# Altium footprint library ALL.PcbLib: 385 footprints (part 16 of 25)
Each footprint in its own frame and in the unit in brackets; x right, y up, seen from the top. Pads: shape width x height; smd on the part's side, far side on the other; paste and mask are expansions set on the pad; w line width, h text height; cw(c..) or ccw(c..) is an arc to the next point about the centre after c.
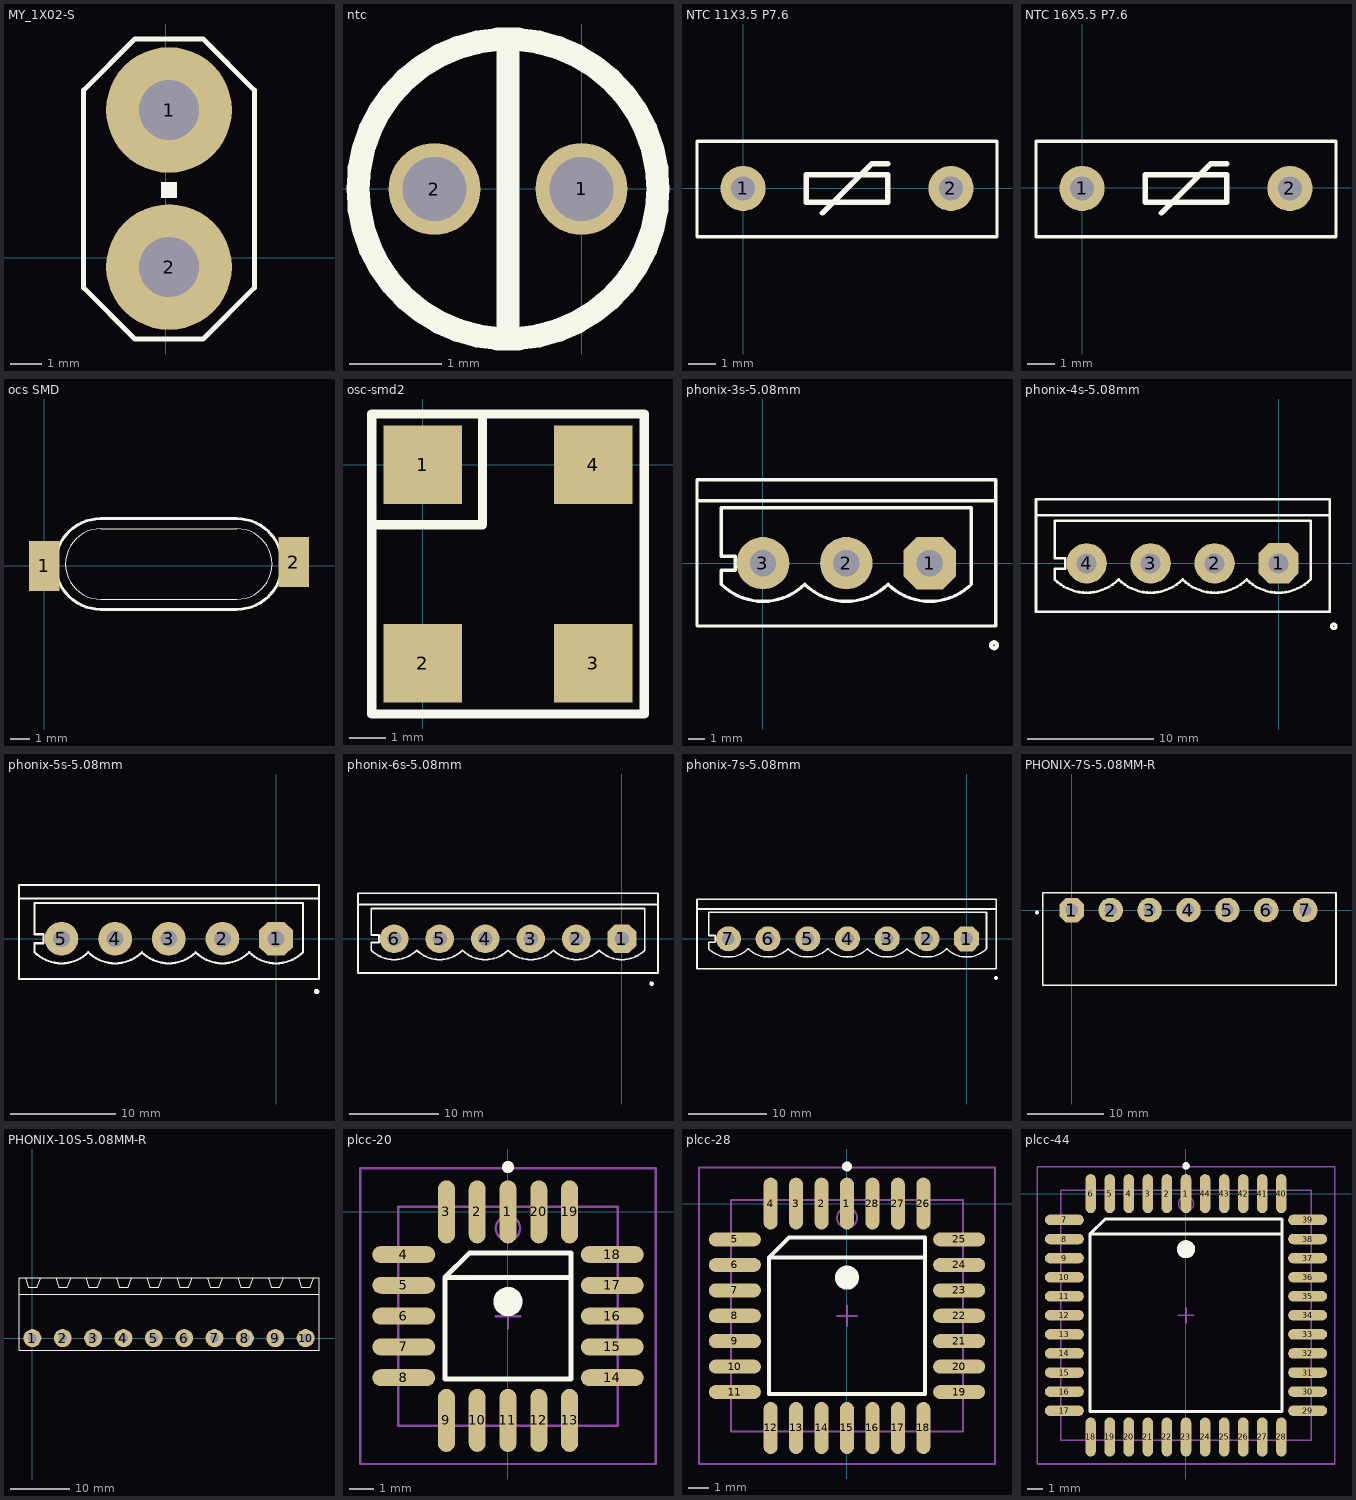
[diagram p15: the footprints below, top view; thin cyan lines are the x and y axes]

## MY_1X02-S [mm]
pads (2):
  round 4 hole 1.9: 1(0.102,4.699) 2(0.102,-0.301)
Top Overlay:
  region: -0.152,4.953 -0.152,4.445 0.356,4.445 0.356,4.953
  region: -0.152,2.413 -0.152,1.905 0.356,1.905 0.356,2.413
  lines w0.15: -0.94,6.96 1.143,6.96
  lines w0.152: -2.616,-0.965 -0.991,-2.591 1.194,-2.591 2.819,-0.965 2.819,5.334 1.194,6.96 -0.991,6.96 -2.616,5.334 -2.616,-0.965

## ntc [mm]
pads (2):
  round 1 hole 0.7: 1(0,0) 2(-1.6,0)
Top Overlay:
  circle w0.254: c-0.8,0 r1.632
  lines w0.254: -0.8,-1.6 -0.8,0 -0.8,1.6
3D body "NTC1.6mm.step": height 2.1, standoff -9, extent -1.8,-0.991 0.2,0.991

## NTC 11X3.5 P7.6 [mil]
pads (2):
  round 65 hole 35: 1(0,0) 2(300,0)
Top Overlay:
  lines w5: -66.47,-69.99 -66.47,68.36 366.43,68.36 366.43,-69.99 -66.47,-69.99
  lines w7.87: 114.57,-35.43 118.5,-31.5 185.43,35.43 209.06,35.43 ; 90.94,-19.68 209.06,-19.68 209.06,19.68 90.94,19.68 90.94,-19.68
3D body "JVR10N331k_vertical.STEP": height 472.44, standoff -98.43, extent -66.47,-69.99 366.47,68.36

## NTC 16X5.5 P7.6 [mil]
pads (2):
  round 65 hole 35: 1(0,-1) 2(300,-1)
Top Overlay:
  lines w5: -66.47,-70.99 366.43,-70.99 366.43,67.36 -66.47,67.36 -66.47,-70.99
  lines w7.87: 114.57,-36.43 118.5,-32.5 185.43,34.43 209.06,34.43 ; 90.94,-20.68 90.94,18.68 209.06,18.68 209.06,-20.68 90.94,-20.68
3D body "User Library-JNR15S060L.STEP": height 898.98, standoff -99.33, extent -162.99,-109.46 466.93,111.16

## ocs SMD [mil]
pads (2):
  rect 60x100 smd: 1(0,0) 2(495.1,7.87)
Top Overlay:
  lines w2: 112.06,-66.07 cw(c112.06,3.93) 112.06,73.93 382.06,73.93 cw(c382.06,3.93) 382.06,-66.07 112.06,-66.07
  lines w6: 112.06,-86.07 cw(c112.06,3.93) 112.06,93.93 382.06,93.93 cw(c382.06,3.93) 382.06,-86.07 112.06,-86.07
3D body "User Library-SMU4.STEP": height 154.3, standoff -3.18, extent 0,-94.49 492.13,94.49

## osc-smd2 [mil]
pads (4):
  rect 85x85 smd: 1(0,0) 2(0,-215) 3(185,-215) 4(185,0)
Top Overlay:
  lines w10: -55,-65 65,-65 65,55 ; -55,-270 240,-270 240,55 -55,55 -55,-270

## phonix-3s-5.08mm [mm]
pads (3):
  oct 3.2x3.2 hole 1.6: 1(10.185,0)
  round 3.2 hole 1.6: 2(5.105,0) 3(0.025,0)
Top Overlay:
  circle w0.254: c14.105,-5 r0.18
  lines w0.203: -3.996,3.81 14.207,3.81 ; -2.519,-1.274 ccw(c0.025,1.27) 2.57,-1.274 ; -2.515,-1.27 -2.515,-0.423 -1.668,-0.423 -1.668,0.423 -2.515,0.423 -2.515,3.387 12.725,3.387 12.725,-1.27 ; 2.561,-1.274 ccw(c5.105,1.27) 7.65,-1.274 ; 7.641,-1.274 ccw(c10.185,1.27) 12.73,-1.274 ; -3.996,-3.825 14.207,-3.825 14.207,5.08 -3.996,5.08 -3.996,-3.825
3D body "MSTBVA-3Way.stp": height 12, standoff -3.9, extent -3.395,-3.825 13.605,4.775

## phonix-4s-5.08mm [mm]
pads (4):
  oct 3.2x3.2 hole 1.6: 1(0,0)
  round 3.2 hole 1.6: 2(-5.08,0) 3(-10.16,0) 4(-15.24,0)
Top Overlay:
  circle w0.254: c4.38,-5 r0.18
  lines w0.203: -19.262,3.81 4.064,3.81 ; -17.784,-1.274 ccw(c-15.24,1.27) -12.696,-1.274 ; -17.78,-1.27 -17.78,-0.423 -16.933,-0.423 -16.933,0.423 -17.78,0.423 -17.78,3.387 2.54,3.387 2.54,-1.27 ; -12.704,-1.274 ccw(c-10.16,1.27) -7.616,-1.274 ; -7.624,-1.274 ccw(c-5.08,1.27) -2.536,-1.274 ; -2.544,-1.274 ccw(c0,1.27) 2.544,-1.274 ; -19.262,-3.825 4.064,-3.825 4.064,5.08 -19.262,5.08 -19.262,-3.825
3D body "MSTBVA-4Way.stp": height 12, standoff -3.9, extent -18.78,-3.81 3.54,4.79

## phonix-5s-5.08mm [mm]
pads (5):
  oct 3.2x3.2 hole 1.6: 1(0,0)
  round 3.2 hole 1.6: 2(-5.08,0) 3(-10.16,0) 4(-15.24,0) 5(-20.32,0)
Top Overlay:
  circle w0.254: c3.84,-5 r0.127
  lines w0.203: -24.342,3.81 4.064,3.81 ; -22.864,-1.274 ccw(c-20.32,1.27) -17.776,-1.274 ; -22.86,-1.27 -22.86,-0.423 -22.013,-0.423 -22.013,0.423 -22.86,0.423 -22.86,3.387 2.54,3.387 2.54,-1.27 ; -17.784,-1.274 ccw(c-15.24,1.27) -12.696,-1.274 ; -12.704,-1.274 ccw(c-10.16,1.27) -7.616,-1.274 ; -7.624,-1.274 ccw(c-5.08,1.27) -2.536,-1.274 ; -2.544,-1.274 ccw(c0,1.27) 2.544,-1.274 ; -24.342,-3.81 -24.342,5.08 4.064,5.08 4.064,-3.81 -24.342,-3.81
3D body "MSTBVA-5Way.stp": height 12, standoff -3.9, extent -23.86,-3.774 3.54,4.826

## phonix-6s-5.08mm [mm]
pads (6):
  oct 3.2x3.2 hole 1.6: 1(0,0)
  round 3.2 hole 1.6: 2(-5.08,0) 3(-10.16,0) 4(-15.24,0) 5(-20.32,0) 6(-25.4,0)
Top Overlay:
  circle w0.254: c3.3,-5 r0.127
  lines w0.203: -29.422,3.81 4.022,3.81 ; -27.944,-1.274 ccw(c-25.4,1.27) -22.856,-1.274 ; -27.94,-1.27 -27.94,-0.423 -27.093,-0.423 -27.093,0.423 -27.94,0.423 -27.94,3.387 2.54,3.387 2.54,-1.27 ; -22.864,-1.274 ccw(c-20.32,1.27) -17.776,-1.274 ; -17.784,-1.274 ccw(c-15.24,1.27) -12.696,-1.274 ; -12.704,-1.274 ccw(c-10.16,1.27) -7.616,-1.274 ; -7.624,-1.274 ccw(c-5.08,1.27) -2.536,-1.274 ; -2.544,-1.274 ccw(c0,1.27) 2.544,-1.274 ; -29.422,-3.81 4.022,-3.81 4.022,5.08 -29.422,5.08 -29.422,-3.81
3D body "MSTBVA-6Way.stp": height 12, standoff -3.9, extent -28.94,-3.799 3.54,4.801

## phonix-7s-5.08mm [mm]
pads (7):
  oct 3.2x3.2 hole 1.6: 1(0,0)
  round 3.2 hole 1.6: 2(-5.08,0) 3(-10.16,0) 4(-15.24,0) 5(-20.32,0) 6(-25.4,0) 7(-30.48,0)
Top Overlay:
  circle w0.254: c3.76,-5 r0.127
  lines w0.203: -34.502,3.81 3.81,3.81 ; -33.024,-1.274 ccw(c-30.48,1.27) -27.936,-1.274 ; -33.02,-1.27 -33.02,-0.423 -32.173,-0.423 -32.173,0.423 -33.02,0.423 -33.02,3.387 2.54,3.387 2.54,-1.27 ; -27.944,-1.274 ccw(c-25.4,1.27) -22.856,-1.274 ; -22.864,-1.274 ccw(c-20.32,1.27) -17.776,-1.274 ; -17.784,-1.274 ccw(c-15.24,1.27) -12.696,-1.274 ; -12.704,-1.274 ccw(c-10.16,1.27) -7.616,-1.274 ; -7.624,-1.274 ccw(c-5.08,1.27) -2.536,-1.274 ; -2.544,-1.274 ccw(c0,1.27) 2.544,-1.274 ; -34.502,-3.81 -34.502,5.08 3.81,5.08 3.81,-3.81 -34.502,-3.81
3D body "MSTBVA-7Way.stp": height 12, standoff -3.9, extent -33.74,-3.901 3.26,4.699

## PHONIX-7S-5.08MM-R [mm]
pads (7):
  oct 3.2x3.2 hole 1.6: 1(0,0)
  round 3.2 hole 1.6: 2(5.08,0) 3(10.16,0) 4(15.24,0) 5(20.32,0) 6(25.4,0) 7(30.48,0)
Top Overlay:
  circle w0.254: c-4.547,-0.309 r0.127
  lines w0.203: -3.81,-9.804 -3.81,2.235 34.502,2.235 34.502,-9.804 -3.81,-9.804

## PHONIX-10S-5.08MM-R [mm]
pads (10):
  round 3 hole 1.5: 1(0,0) 2(5.08,0) 3(10.16,0) 4(15.24,0) 5(20.32,0) 6(25.4,0) 7(30.48,0) 8(35.56,0) 9(40.64,0) 10(45.72,0)
Top Overlay:
  lines w0.2: -2.24,7.3 47.96,7.3 ; -1.21,10.1 -0.71,8.5 0.79,8.5 1.39,10.1 ; 3.87,10.1 4.37,8.5 5.87,8.5 6.47,10.1 ; 8.95,10.1 9.45,8.5 10.95,8.5 11.55,10.1 ; 14.03,10.1 14.53,8.5 16.03,8.5 16.63,10.1 ; 19.11,10.1 19.61,8.5 21.11,8.5 21.71,10.1 ; 24.19,10.1 24.69,8.5 26.19,8.5 26.79,10.1 ; 29.27,10.1 29.77,8.5 31.27,8.5 31.87,10.1 ; 34.35,10.1 34.85,8.5 36.35,8.5 36.95,10.1 ; 39.43,10.1 39.93,8.5 41.43,8.5 42.03,10.1 ; 44.51,10.1 45.01,8.5 46.51,8.5 47.11,10.1 ; -2.24,-2.032 47.96,-2.032 47.96,10.1 -2.24,10.1 -2.24,-2.032
3D body "PHOENIX_MSTB10.stp": height 8.6, standoff -3.5, extent -2.14,-2 47.86,10

## plcc-20 [mm]
pads (20):
  oval 0.7x2.6 smd: 1(0,0) 2(-1.27,0) 3(-2.54,0) 9(-2.54,-8.6) 10(-1.27,-8.6) 11(0,-8.6) 12(1.27,-8.6) 13(2.54,-8.6) 19(2.54,0) 20(1.27,0)
  oval 2.6x0.7 smd: 4(-4.3,-1.76) 5(-4.3,-3.03) 6(-4.3,-4.3) 7(-4.3,-5.57) 8(-4.3,-6.84) 14(4.3,-6.84) 15(4.3,-5.57) 16(4.3,-4.3) 17(4.3,-3.03) 18(4.3,-1.76)
Top Overlay:
  circle w0.6: c0,-3.7 r0.3
  circle w0.25: c0,1.85 r0.125
  lines w0.2: 2.6,-2.7 -2.6,-2.7 ; -2.6,-2.7 -2.6,-6.9 2.6,-6.9 2.6,-1.7 -1.6,-1.7 -2.6,-2.7
Mechanical 13:
  circle w0.1: c0,-0.68 r0.5
  lines w0.1: -4.52,-8.82 4.52,-8.82 4.52,0.22 -4.52,0.22 -4.52,-8.82
Mechanical 15:
  lines w0.1: -0.5,-4.3 0.5,-4.3 ; 0,-4.8 0,-3.8 ; -6.1,-10.4 6.1,-10.4 6.1,1.8 -6.1,1.8 -6.1,-10.4
3D body "HCTL-2017-PLC--3DModel-STEP-56544.STEP": height 4.58, standoff 0.01, extent -4.8,-9.322 5.105,0.584

## plcc-28 [mm]
pads (28):
  oval 0.7x2.6 smd: 1(0,0) 2(-1.27,0) 3(-2.54,0) 4(-3.81,0) 12(-3.81,-11.2) 13(-2.54,-11.2) 14(-1.27,-11.2) 15(0,-11.2) 16(1.27,-11.2) 17(2.54,-11.2) 18(3.81,-11.2) 26(3.81,0) 27(2.54,0) 28(1.27,0)
  oval 2.6x0.7 smd: 5(-5.6,-1.79) 6(-5.6,-3.06) 7(-5.6,-4.33) 8(-5.6,-5.6) 9(-5.6,-6.87) 10(-5.6,-8.14) 11(-5.6,-9.41) 19(5.6,-9.41) 20(5.6,-8.14) 21(5.6,-6.87) 22(5.6,-5.6) 23(5.6,-4.33) 24(5.6,-3.06) 25(5.6,-1.79)
Top Overlay:
  circle w0.6: c0,-3.7 r0.3
  circle w0.25: c0,1.85 r0.125
  lines w0.2: 3.9,-2.7 -3.9,-2.7 ; -3.9,-2.7 -3.9,-9.5 3.9,-9.5 3.9,-1.7 -2.9,-1.7 -3.9,-2.7
Mechanical 13:
  circle w0.1: c0,-0.71 r0.5
  lines w0.1: -5.79,-11.39 5.79,-11.39 5.79,0.19 -5.79,0.19 -5.79,-11.39
Mechanical 15:
  lines w0.1: -0.5,-5.6 0.5,-5.6 ; 0,-6.1 0,-5.1 ; -7.4,-13 7.4,-13 7.4,1.8 -7.4,1.8 -7.4,-13
3D body "step_temp.STEP": height 4.57, standoff 0, extent -6.248,-11.786 6.198,0.66

## plcc-44 [mm]
pads (44):
  oval 0.7x2.6 smd: 1(0,0) 2(-1.27,0) 3(-2.54,0) 4(-3.81,0) 5(-5.08,0) 6(-6.35,0) 18(-6.35,-16.2) 19(-5.08,-16.2) 20(-3.81,-16.2) 21(-2.54,-16.2) 22(-1.27,-16.2) 23(0,-16.2) 24(1.27,-16.2) 25(2.54,-16.2) 26(3.81,-16.2) 27(5.08,-16.2) 28(6.35,-16.2) 40(6.35,0) 41(5.08,0) 42(3.81,0) 43(2.54,0) 44(1.27,0)
  oval 2.6x0.7 smd: 7(-8.1,-1.75) 8(-8.1,-3.02) 9(-8.1,-4.29) 10(-8.1,-5.56) 11(-8.1,-6.83) 12(-8.1,-8.1) 13(-8.1,-9.37) 14(-8.1,-10.64) 15(-8.1,-11.91) 16(-8.1,-13.18) 17(-8.1,-14.45) 29(8.1,-14.45) 30(8.1,-13.18) 31(8.1,-11.91) 32(8.1,-10.64) 33(8.1,-9.37) 34(8.1,-8.1) 35(8.1,-6.83) 36(8.1,-5.56) 37(8.1,-4.29) 38(8.1,-3.02) 39(8.1,-1.75)
Top Overlay:
  circle w0.25: c0,1.85 r0.125
  circle w0.6: c0,-3.7 r0.3
  lines w0.2: 6.4,-2.7 -6.4,-2.7 ; -6.4,-2.7 -5.4,-1.7 6.4,-1.7 6.4,-14.5 -6.4,-14.5 -6.4,-2.7
Mechanical 13:
  circle w0.1: c0,-0.67 r0.5
  lines w0.1: -8.33,-16.43 -8.33,0.23 8.33,0.23 8.33,-16.43 -8.33,-16.43
Mechanical 15:
  lines w0.1: -0.5,-8.1 0.5,-8.1 ; 0,-8.6 0,-7.6 ; -9.9,-18 -9.9,1.8 9.9,1.8 9.9,-18 -9.9,-18
3D body "User Library-plcc-44p1658x1658ls127h439.step": height 4.39, standoff 0, extent -8.762,-16.862 8.763,0.662